# Altium footprint library Supernova Connectors.PcbLib: 303 footprints (part 16 of 19)
Each footprint in its own frame and in the unit in brackets; x right, y up, seen from the top. Pads: shape width x height; smd on the part's side, far side on the other; paste and mask are expansions set on the pad; w line width, h text height; cw(c..) or ccw(c..) is an arc to the next point about the centre after c.
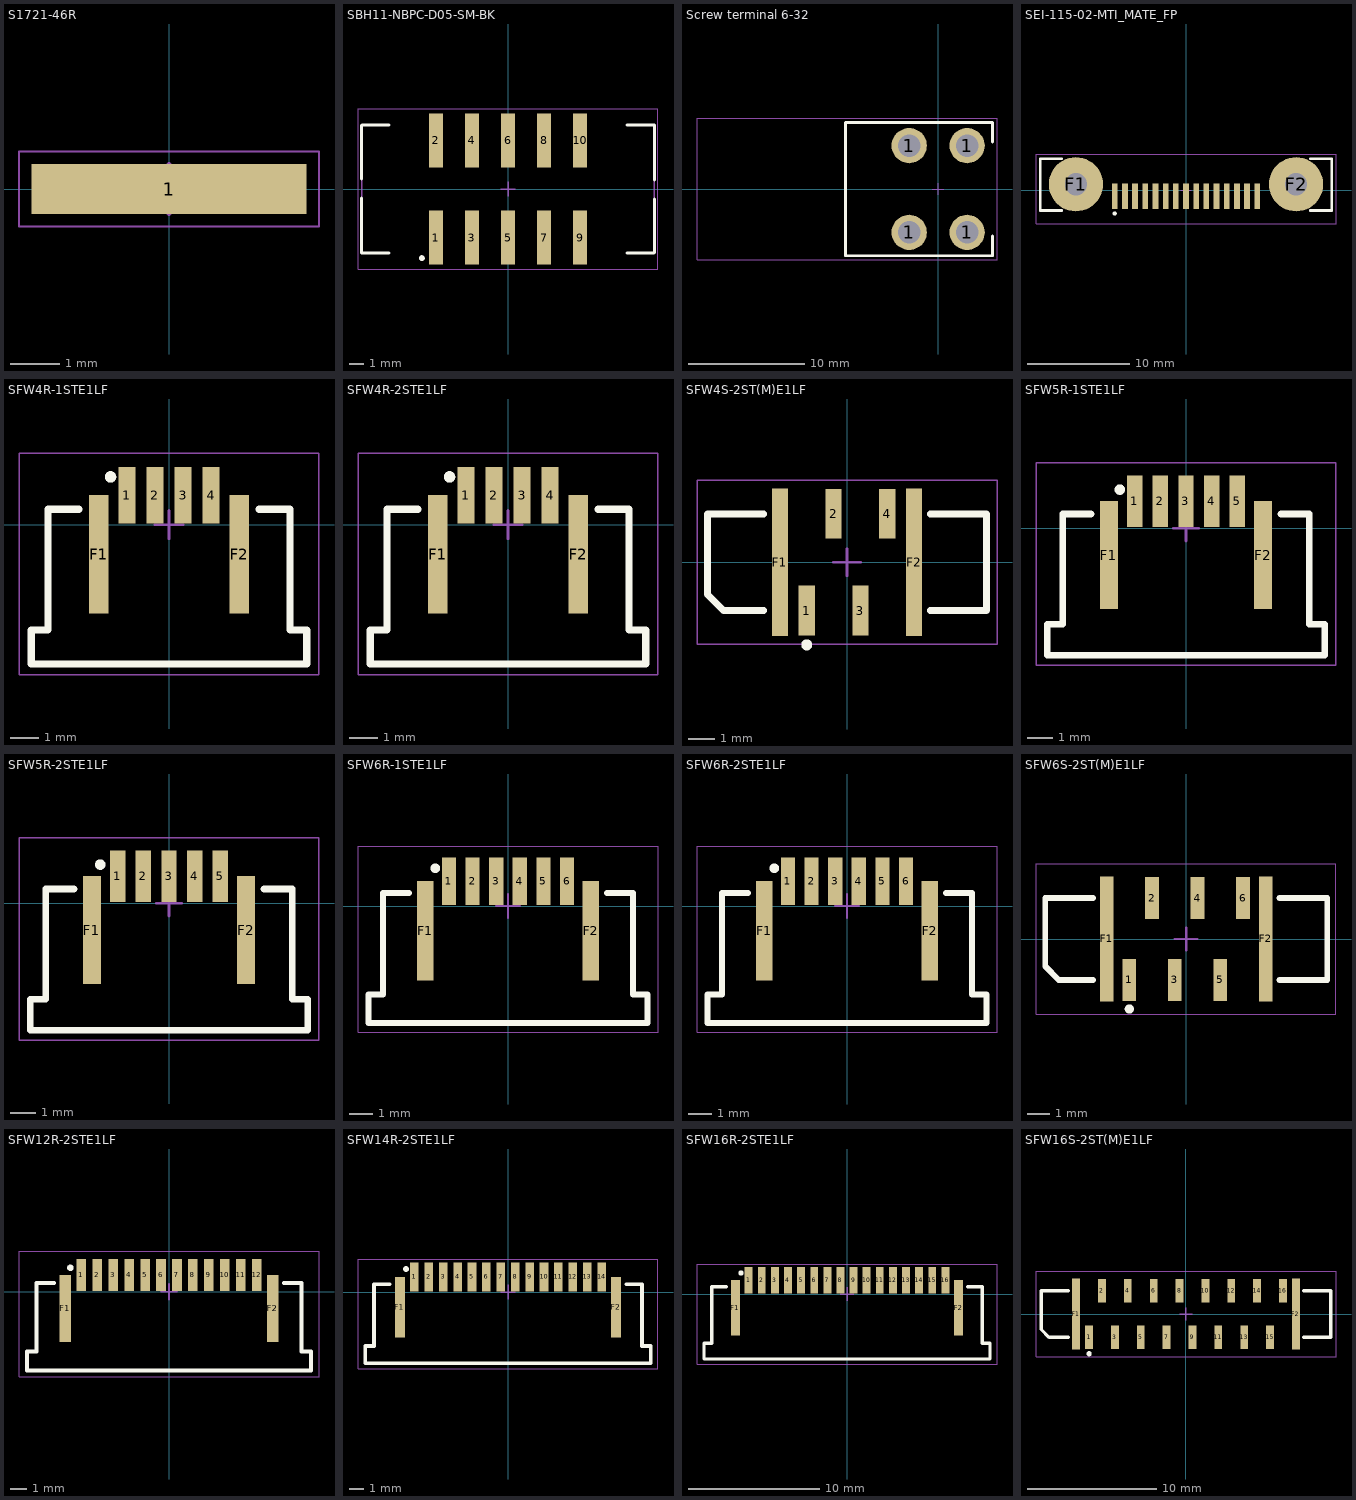
[diagram p15: the footprints below, top view; thin cyan lines are the x and y axes]

## S1721-46R [mm] "EMI Shield Clip"
pads (1):
  rect 5.59x1.02 smd: 1(0,0)
Top Courtyard:
  lines w0.05: -3.048,-0.762 3.048,-0.762 3.048,0.762 -3.048,0.762 -3.048,-0.762
  lines w0.1: -0.5,0 0.5,0 ; 0,-0.5 0,0.5
3D body "s1721-46r.stp": height 2.23, standoff 0, extent -2.625,-0.535 2.625,0.536

## SBH11-NBPC-D05-SM-BK [mm]
pads (10):
  rect 1x3.75 smd: 1(-5,-3.375) 2(-5,3.375) 3(-2.5,-3.375) 4(-2.5,3.375) 5(0,-3.375) 6(0,3.375) 7(2.5,-3.375) 8(2.5,3.375) 9(5,-3.375) 10(5,3.375)
Top Overlay:
  circle w0.203: c-5.978,-4.8 r0.102
  lines w0.2: -10.16,-0.635 -10.16,-4.441 -8.255,-4.441 ; -10.16,0.7 -10.16,4.42 -10.139,4.441 -8.255,4.441 ; 8.255,-4.441 10.139,-4.441 10.16,-4.42 10.16,-0.7 ; 8.255,4.441 10.16,4.441 10.16,0.635
Top 3D Body:
  lines w0.1: -10.16,-4.191 -10.16,4.191 ; 10.16,-4.191 10.16,4.191
Top Courtyard:
  lines w0.05: -10.414,-5.588 10.414,-5.588 10.414,5.588 -10.414,5.588 -10.414,-5.588
  lines w0.1: -0.5,0 0.5,0 ; 0,-0.5 0,0.5
3D body "61201020621 (rev1).stp": height 10.42, standoff 0, extent -10.16,-4.75 10.16,4.75

## Screw terminal 6-32 [mil]
pads (4):
  round 120 hole 76: 1(-98.43,-147.5) 1(-98.43,147.5) 1(98.43,-147.5) 1(98.43,147.5)
Top Overlay:
  lines w10: 185,-160 185,-227 -315,-227 -315,226 185,226 185,160
Top Courtyard:
  lines w1.97: -820,-240 200,-240 200,240 -820,240 -820,-240
  lines w3.94: -19.69,0 19.68,0 ; 0,-19.68 0,19.68
3D body "keystone-PN7690.STEP": height 314.22, standoff -198.78, extent -808.27,-204.55 162.18,204.82

## SEI-115-02-MTI_MATE_FP [mm]
height 1.3
pads (17):
  rect 0.56x2.54 smd mask+0.05: 1(-7,-0.587) 2(-6,-0.587) 3(-5,-0.587) 4(-4,-0.587) 5(-3,-0.587) 6(-2,-0.587) 7(-1,-0.587) 8(0,-0.587) 9(1,-0.587) 10(2,-0.587) 11(3,-0.587) 12(4,-0.587) 13(5,-0.587) 14(6,-0.587) 15(7,-0.587)
  round 5.334 hole 2.184 unplated mask+0.05: F1(-10.81,0.587) F2(10.81,0.587)
Top Overlay:
  circle w0.203: c-7,-2.278 r0.102
  lines w0.254: -12.2,-1.987 -14.3,-1.987 -14.3,3.113 -12.2,3.113 ; 12.2,-1.987 14.3,-1.987 14.3,3.113 12.2,3.113
Top Courtyard:
  lines w0.05: -14.732,-3.302 -14.732,3.556 14.732,3.556 14.732,-3.302 -14.732,-3.302
  lines w0.1: -0.5,0 0.5,0 ; 0,-0.5 0,0.5
3D body "SEI-115-02-GF-S-M-AB.stp": height 2.91, standoff -0.47, extent -14.254,-3.051 14.224,3.045

## SFW4R-1STE1LF [mm]
height 2.7
pads (6):
  rect 0.6x2 smd mask+0.038: 1(-1.5,1.05) 2(-0.5,1.05) 3(0.5,1.05) 4(1.5,1.05)
  rect 0.7x4.2 smd mask+0.038: F1(-2.5,-1.05) F2(2.5,-1.05)
Top Overlay:
  circle w0.203: c-2.078,1.7 r0.102
  lines w0.254: -3.2,0.55 -4.3,0.55 -4.3,-3.75 -4.9,-3.75 -4.9,-4.95 4.9,-4.95 4.9,-3.75 4.3,-3.75 4.3,0.55 3.2,0.55
Top 3D Body:
  text "BOTTOM" at -2.848,-4.338 h1
Top Courtyard:
  lines w0.05: -5.334,-5.334 -5.334,2.54 5.334,2.54 5.334,-5.334 -5.334,-5.334
  lines w0.1: -0.5,0 0.5,0 ; 0,-0.5 0,0.5
3D body "sfw4r1ste1lf.STEP": height 2.7, standoff 0, extent -4.9,-4.85 4.9,1.65

## SFW4R-2STE1LF [mm]
height 2.7
pads (6):
  rect 0.6x2 smd mask+0.038: 1(-1.5,1.05) 2(-0.5,1.05) 3(0.5,1.05) 4(1.5,1.05)
  rect 0.7x4.2 smd mask+0.038: F1(-2.5,-1.05) F2(2.5,-1.05)
Top Overlay:
  circle w0.203: c-2.078,1.7 r0.102
  lines w0.254: -3.2,0.55 -4.3,0.55 -4.3,-3.75 -4.9,-3.75 -4.9,-4.95 4.9,-4.95 4.9,-3.75 4.3,-3.75 4.3,0.55 3.2,0.55
Top Courtyard:
  lines w0.05: -5.334,-5.334 -5.334,2.54 5.334,2.54 5.334,-5.334 -5.334,-5.334
  lines w0.1: -0.5,0 0.5,0 ; 0,-0.5 0,0.5
3D body "sfw4r2ste1lf.STEP": height 2.7, standoff 0, extent -4.9,-4.85 4.9,1.65

## SFW4S-2ST(M)E1LF [mm]
pads (6):
  rect 0.6x1.85 smd: 1(-1.5,-1.8) 2(-0.5,1.8) 3(0.5,-1.8) 4(1.5,1.8)
  rect 0.6x5.5 smd: F1(-2.5,0) F2(2.5,0)
Top Overlay:
  circle w0.203: c-1.5,-3.078 r0.102
  lines w0.254: -3.1,-1.8 -4.6,-1.8 -5.2,-1.2 -5.2,1.8 -3.1,1.8 ; 3.1,-1.8 5.2,-1.8 5.2,1.8 3.1,1.8
Top Courtyard:
  lines w0.05: -5.588,-3.048 5.588,-3.048 5.588,3.048 -5.588,3.048 -5.588,-3.048
  lines w0.1: -0.5,0 0.5,0 ; 0,-0.5 0,0.5
3D body "ssfw4s-2stmlf.STEP": height 5.27, standoff -0.03, extent -5.2,-2.25 5.2,2.25

## SFW5R-1STE1LF [mm]
height 2.7
pads (7):
  rect 0.6x2 smd mask+0.038: 1(-2,1.05) 2(-1,1.05) 3(0,1.05) 4(1,1.05) 5(2,1.05)
  rect 0.7x4.2 smd mask+0.038: F1(-3,-1.05) F2(3,-1.05)
Top Overlay:
  circle w0.203: c-2.578,1.5 r0.102
  lines w0.254: -3.7,0.55 -4.8,0.55 -4.8,-3.75 -5.4,-3.75 -5.4,-4.95 5.4,-4.95 5.4,-3.75 4.8,-3.75 4.8,0.55 3.7,0.55
Top 3D Body:
  text "BOTTOM" at -2.848,-4.338 h1
Top Courtyard:
  lines w0.05: -5.842,-5.334 -5.842,2.54 5.842,2.54 5.842,-5.334 -5.842,-5.334
  lines w0.1: -0.5,0 0.5,0 ; 0,-0.5 0,0.5
3D body "Untitled_J225 v1.step": height 2.7, standoff 0, extent -5.4,-4.95 5.4,1.55

## SFW5R-2STE1LF [mm]
height 2.7
pads (7):
  rect 0.6x2 smd mask+0.038: 1(-2,1.05) 2(-1,1.05) 3(0,1.05) 4(1,1.05) 5(2,1.05)
  rect 0.7x4.2 smd mask+0.038: F1(-3,-1.05) F2(3,-1.05)
Top Overlay:
  circle w0.203: c-2.678,1.5 r0.102
  lines w0.254: -3.7,0.55 -4.8,0.55 -4.8,-3.75 -5.4,-3.75 -5.4,-4.95 5.4,-4.95 5.4,-3.75 4.8,-3.75 4.8,0.55 3.7,0.55
Top Courtyard:
  lines w0.05: -5.842,-5.334 -5.842,2.54 5.842,2.54 5.842,-5.334 -5.842,-5.334
  lines w0.1: -0.5,0 0.5,0 ; 0,-0.5 0,0.5
3D body "Untitled_H2 v1.step": height 2.7, standoff 0, extent -5.4,-4.95 5.4,1.55

## SFW6R-1STE1LF [mm]
height 2.7
pads (8):
  rect 0.6x2 smd mask+0.038: 1(-2.5,1.05) 2(-1.5,1.05) 3(-0.5,1.05) 4(0.5,1.05) 5(1.5,1.05) 6(2.5,1.05)
  rect 0.7x4.2 smd mask+0.038: F1(-3.5,-1.05) F2(3.5,-1.05)
Top Overlay:
  circle w0.203: c-3.078,1.6 r0.102
  lines w0.254: -4.2,0.55 -5.3,0.55 -5.3,-3.75 -5.9,-3.75 -5.9,-4.95 5.9,-4.95 5.9,-3.75 5.3,-3.75 5.3,0.55 4.2,0.55
Top 3D Body:
  text "BOTTOM" at -2.848,-4.338 h1
Top Courtyard:
  lines w0.05: -6.35,-5.334 -6.35,2.54 6.35,2.54 6.35,-5.334 -6.35,-5.334
  lines w0.1: -0.5,0 0.5,0 ; 0,-0.5 0,0.5
3D body "sfw6r1ste1lf.STEP": height 2.7, standoff 0, extent -5.9,-4.85 5.9,1.65

## SFW6R-2STE1LF [mm]
height 2.7
pads (8):
  rect 0.6x2 smd mask+0.038: 1(-2.5,1.05) 2(-1.5,1.05) 3(-0.5,1.05) 4(0.5,1.05) 5(1.5,1.05) 6(2.5,1.05)
  rect 0.7x4.2 smd mask+0.038: F1(-3.5,-1.05) F2(3.5,-1.05)
Top Overlay:
  circle w0.203: c-3.078,1.6 r0.102
  lines w0.254: -4.2,0.55 -5.3,0.55 -5.3,-3.75 -5.9,-3.75 -5.9,-4.95 5.9,-4.95 5.9,-3.75 5.3,-3.75 5.3,0.55 4.2,0.55
Top Courtyard:
  lines w0.05: -6.35,-5.334 -6.35,2.54 6.35,2.54 6.35,-5.334 -6.35,-5.334
  lines w0.1: -0.5,0 0.5,0 ; 0,-0.5 0,0.5
3D body "sfw6r2ste1lf.STEP": height 2.7, standoff 0, extent -5.9,-4.85 5.9,1.65

## SFW6S-2ST(M)E1LF [mm]
pads (8):
  rect 0.6x1.85 smd: 1(-2.5,-1.8) 2(-1.5,1.8) 3(-0.5,-1.8) 4(0.5,1.8) 5(1.5,-1.8) 6(2.5,1.8)
  rect 0.6x5.5 smd: F1(-3.5,0) F2(3.5,0)
Top Overlay:
  circle w0.203: c-2.5,-3.078 r0.102
  lines w0.254: -4.1,-1.8 -5.6,-1.8 -6.2,-1.2 -6.2,1.8 -4.1,1.8 ; 4.1,-1.8 6.2,-1.8 6.2,1.8 4.1,1.8
Top Courtyard:
  lines w0.05: -6.604,-3.302 -6.604,3.302 6.588,3.302 6.588,-3.302 -6.604,-3.302
  lines w0.1: -0.5,0 0.5,0 ; 0,-0.5 0,0.5
3D body "ssfw6s-2stmlf.STEP": height 5.27, standoff -0.03, extent -6.2,-2.25 6.2,2.25

## SFW12R-2STE1LF [mm]
height 2.7
pads (14):
  rect 0.6x2 smd mask+0.038: 1(-5.5,1.05) 2(-4.5,1.05) 3(-3.5,1.05) 4(-2.5,1.05) 5(-1.5,1.05) 6(-0.5,1.05) 7(0.5,1.05) 8(1.5,1.05) 9(2.5,1.05) 10(3.5,1.05) 11(4.5,1.05) 12(5.5,1.05)
  rect 0.7x4.2 smd mask+0.038: F1(-6.5,-1.05) F2(6.5,-1.05)
Top Overlay:
  circle w0.203: c-6.178,1.5 r0.102
  lines w0.254: -7.2,0.55 -8.3,0.55 -8.3,-3.75 -8.9,-3.75 -8.9,-4.95 8.9,-4.95 8.9,-3.75 8.3,-3.75 8.3,0.55 7.2,0.55
Top Courtyard:
  lines w0.05: -9.398,-5.334 -9.398,2.54 9.398,2.54 9.398,-5.334 -9.398,-5.334
  lines w0.1: -0.5,0 0.5,0 ; 0,-0.5 0,0.5
3D body "ssfw12r_2_4st_lf.stp": height 2.7, standoff 0, extent -8.9,-4.95 8.9,1.55

## SFW14R-2STE1LF [mm]
height 2.7
pads (16):
  rect 0.6x2 smd mask+0.038: 1(-6.5,1.05) 2(-5.5,1.05) 3(-4.5,1.05) 4(-3.5,1.05) 5(-2.5,1.05) 6(-1.5,1.05) 7(-0.5,1.05) 8(0.5,1.05) 9(1.5,1.05) 10(2.5,1.05) 11(3.5,1.05) 12(4.5,1.05) 13(5.5,1.05) 14(6.5,1.05)
  rect 0.7x4.2 smd mask+0.038: F1(-7.5,-1.05) F2(7.5,-1.05)
Top Overlay:
  circle w0.203: c-7.078,1.6 r0.102
  lines w0.254: -8.2,0.55 -9.3,0.55 -9.3,-3.75 -9.9,-3.75 -9.9,-4.95 9.9,-4.95 9.9,-3.75 9.3,-3.75 9.3,0.55 8.2,0.55
Top Courtyard:
  lines w0.05: -10.414,-5.334 -10.414,2.286 10.414,2.286 10.414,-5.334 -10.414,-5.334
  lines w0.1: -0.5,0 0.5,0 ; 0,-0.5 0,0.5
3D body "ssfw14r_2_4st_lf.stp": height 2.7, standoff 0, extent -9.9,-4.95 9.9,1.55

## SFW16R-2STE1LF [mm]
height 2.7
pads (18):
  rect 0.6x2 smd mask+0.038: 1(-7.5,1.05) 2(-6.5,1.05) 3(-5.5,1.05) 4(-4.5,1.05) 5(-3.5,1.05) 6(-2.5,1.05) 7(-1.5,1.05) 8(-0.5,1.05) 9(0.5,1.05) 10(1.5,1.05) 11(2.5,1.05) 12(3.5,1.05) 13(4.5,1.05) 14(5.5,1.05) 15(6.5,1.05) 16(7.5,1.05)
  rect 0.7x4.2 smd mask+0.038: F1(-8.5,-1.05) F2(8.5,-1.05)
Top Overlay:
  circle w0.203: c-8.078,1.6 r0.102
  lines w0.254: -9.2,0.55 -10.3,0.55 -10.3,-3.75 -10.9,-3.75 -10.9,-4.95 10.9,-4.95 10.9,-3.75 10.3,-3.75 10.3,0.55 9.2,0.55
Top Courtyard:
  lines w0.05: -11.43,-5.334 11.43,-5.334 11.43,2.286 -11.43,2.286 -11.43,-5.334
  lines w0.1: -0.5,0 0.5,0 ; 0,-0.5 0,0.5
3D body "ssfw16r_2_4st_lf.stp": height 2.7, standoff 0, extent -10.9,-4.95 10.9,1.55

## SFW16S-2ST(M)E1LF [mm]
pads (18):
  rect 0.6x1.85 smd: 1(-7.5,-1.8) 2(-6.5,1.8) 3(-5.5,-1.8) 4(-4.5,1.8) 5(-3.5,-1.8) 6(-2.5,1.8) 7(-1.5,-1.8) 8(-0.5,1.8) 9(0.5,-1.8) 10(1.5,1.8) 11(2.5,-1.8) 12(3.5,1.8) 13(4.5,-1.8) 14(5.5,1.8) 15(6.5,-1.8) 16(7.5,1.8)
  rect 0.6x5.5 smd: F1(-8.5,0) F2(8.5,0)
Top Overlay:
  circle w0.203: c-7.5,-3.078 r0.102
  lines w0.254: -9.1,-1.8 -10.6,-1.8 -11.2,-1.2 -11.2,1.8 -9.1,1.8 ; 9.1,-1.8 11.2,-1.8 11.2,1.8 9.1,1.8
Top Courtyard:
  lines w0.05: -11.604,-3.302 -11.604,3.302 11.604,3.302 11.604,-3.302 -11.604,-3.302
  lines w0.1: -0.5,0 0.5,0 ; 0,-0.5 0,0.5
3D body "ssfw16s-2stmlf.stp": height 5.28, standoff -0.02, extent -11.2,-2.25 11.2,2.25